# Altium footprint library PCB_LIB.PcbLib: 116 footprints (part 1 of 8)
Each footprint in its own frame and in the unit in brackets; x right, y up, seen from the top. Pads: shape width x height; smd on the part's side, far side on the other; paste and mask are expansions set on the pad; w line width, h text height; cw(c..) or ccw(c..) is an arc to the next point about the centre after c.
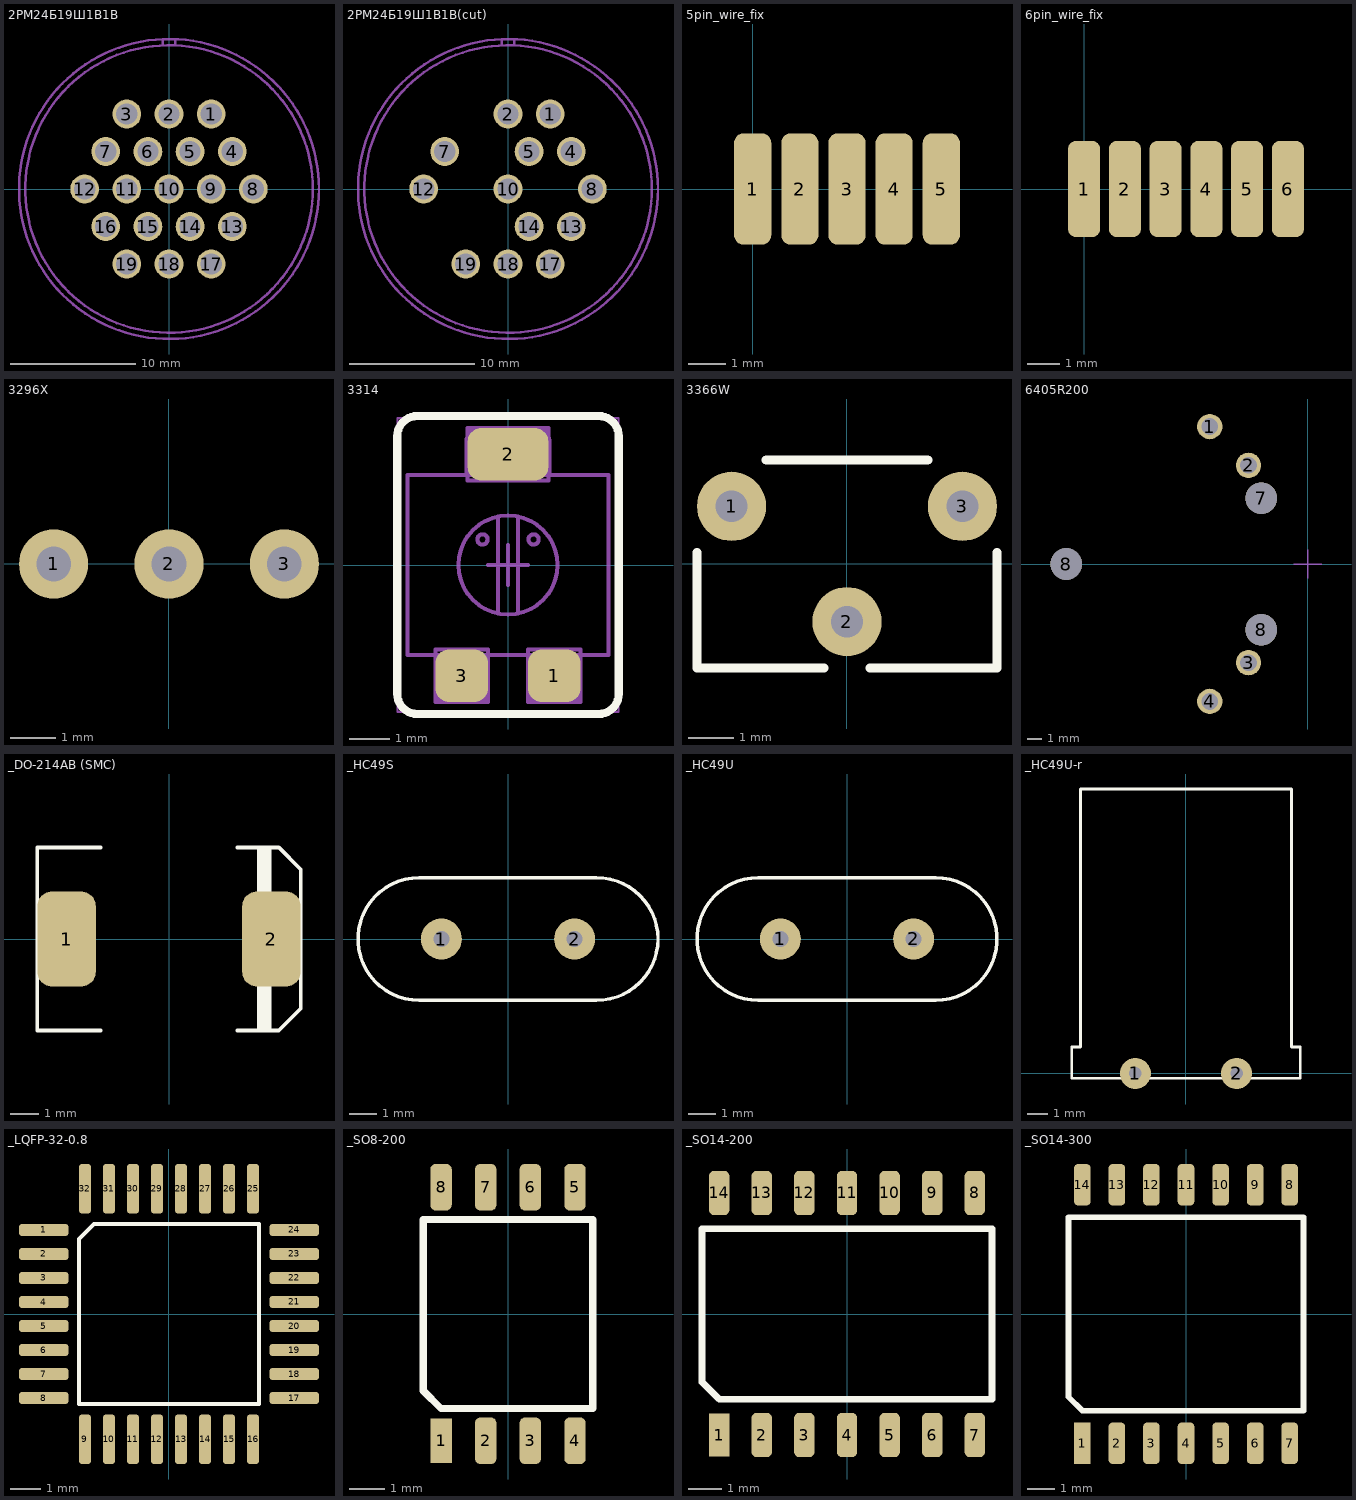
[diagram p0: the footprints below, top view; thin cyan lines are the x and y axes]

## 2РМ24Б19Ш1В1В [mm]
pads (19):
  round 2.3 hole 1.7: 1(3.375,6) 2(0,6) 3(-3.375,6) 4(5.062,3) 5(1.687,3) 6(-1.687,3) 7(-5.062,3) 8(6.75,0) 9(3.375,0) 10(0,0) 11(-3.375,0) 12(-6.75,0) 13(5.062,-3) 14(1.687,-3) 15(-1.687,-3) 16(-5.062,-3) 17(3.375,-6) 18(0,-6) 19(-3.375,-6)
Mechanical 14:
  circle w0.2: c0,0 r12
  circle w0.2: c0,0 r11.5
  lines w0.2: -0.5,11.5 -0.5,12 0.5,12 0.5,11.5

## 2РМ24Б19Ш1В1В(cut) [mm]
pads (13):
  round 2.3 hole 1.7: 1(3.375,6) 2(0,6) 4(5.062,3) 5(1.687,3) 7(-5.062,3) 8(6.75,0) 10(0,0) 12(-6.75,0) 13(5.062,-3) 14(1.687,-3) 17(3.375,-6) 18(0,-6) 19(-3.375,-6)
Mechanical 14:
  circle w0.2: c0,0 r12
  circle w0.2: c0,0 r11.5
  lines w0.2: -0.5,11.5 -0.5,12 0.5,12 0.5,11.5

## 5pin_wire_fix [mm]
pads (5):
  rrect50% 1x3 smd: 1(0,0) 2(1.27,0) 3(2.54,0) 4(3.81,0) 5(5.08,0)

## 6pin_wire_fix [mm]
pads (6):
  rrect50% 1x3 smd: 1(0,0) 2(1.27,0) 3(2.54,0) 4(3.81,0) 5(5.08,0) 6(6.35,0)

## 3296X [mil] "Потенциометр"
pads (3):
  round 60 hole 30: 1(-100,0) 2(0,0) 3(100,0)
3D body "User Library-3296X.step": height 394.88, standoff -62.99, extent -192.12,-100 242.12,88.98

## 3314 [mm] "Bourns 3314G-1 Single Turn 4mm Square Trimpot® Trimming Potentiometer (Top Adjust)"
height 2.55
pads (3):
  rrect50% 1.3x1.3 smd: 1(1.15,-2.75) 3(-1.15,-2.75)
  rrect50% 2x1.3 smd: 2(0,2.75)
Top Overlay:
  lines w0.2: -2.75,3.175 -2.75,-3.2 ccw(c-2.25,-3.2) -2.25,-3.7 2.25,-3.7 ccw(c2.25,-3.2) 2.75,-3.2 2.75,3.2 ccw(c2.25,3.2) 2.25,3.7 0,3.7 -2.225,3.7 ; -2.75,3.2 cw(c-2.25,3.2) -2.25,3.7
Mechanical 8:
  lines w0.1: -1.65,-2.75 -1.15,-2.75 ; -1.15,-3.25 -1.15,-2.75 ; -1.15,-2.25 -1.15,-2.75 ; -0.65,-2.75 -1.15,-2.75 ; -0.5,0 0,0 ; -0.5,2.75 0,2.75 ; 0,-0.5 0,0 ; 0,0.5 0,0 ; 0,2.25 0,2.75 ; 0,3.25 0,2.75 ; 0.5,0 0,0 ; 0.5,2.75 0,2.75 ; 0.65,-2.75 1.15,-2.75 ; 1.15,-3.25 1.15,-2.75 ; 1.15,-2.25 1.15,-2.75 ; 1.65,-2.75 1.15,-2.75 ; -1.8,-3.4 -1.8,-2.1 -0.5,-2.1 -0.5,-3.4 -1.8,-3.4 ; -1,2.1 -1,3.4 1,3.4 1,2.1 -1,2.1 ; 0.5,-3.4 0.5,-2.1 1.8,-2.1 1.8,-3.4 0.5,-3.4
Mechanical 14:
  circle w0.1: c0.635,0.635 r0.127
  circle w0.1: c-0.635,0.635 r0.127
  circle w0.1: c0,0 r1.23
  lines w0.1: -1.8,-2.235 -1.8,-3.1 ccw(c-1.5,-3.1) -1.5,-3.4 -0.775,-3.4 ; -1.575,-2.25 -1.575,-3.025 -0.725,-3.025 -0.725,-2.235 ; -1.025,2.235 -1.025,3.125 ; -1.025,3.1 cw(c-0.725,3.1) -0.725,3.4 ; -0.8,-3.4 ccw(c-0.8,-3.1) -0.5,-3.1 ; -0.8,2.235 -0.8,3.025 0.8,3.025 0.8,2.25 ; -0.75,3.4 0.725,3.4 cw(c0.725,3.1) 1.025,3.1 1.025,2.235 ; -0.5,-3.125 -0.5,-2.235 ; -0.254,-1.203 -0.254,1.204 ; 0.254,-1.203 0.254,1.204 ; 0.5,-2.235 0.5,-3.1 ccw(c0.8,-3.1) 0.8,-3.4 1.525,-3.4 ; 0.725,-2.25 0.725,-3.025 1.575,-3.025 1.575,-2.235 ; 1.5,-3.4 ccw(c1.5,-3.1) 1.8,-3.1 ; 1.8,-3.125 1.8,-2.235 ; -2.5,-2.235 -2.5,2.235 2.5,2.235 2.5,-2.235 -2.5,-2.235
  text ".Comment" at -2.8,-4.75 h1.5
  text ".Designator" at -2.3,-2.335 h1
Mechanical 15:
  lines w0.05: -0.5,0 0.5,0 ; 0,-0.5 0,0.5 ; -2.75,-3.65 -2.75,3.65 2.75,3.65 2.75,-3.65 -2.75,-3.65
3D body "TRIM_BOURNS_3314G-1.stp": height 2.73, standoff 0, extent -2.499,-3.099 2.5,3.099

## 3366W [mil]
pads (3):
  round 60 hole 27.56: 1(-100,50) 2(0,-50) 3(100,50)
Top Overlay:
  lines w7.87: -130,10 -130,-90 -20,-90 ; -70,90 70,90 ; 20,-90 130,-90 130,10
3D body "3266w-1-103.stp": height 312.31, standoff -81.15, extent -132,-90 132,87

## 6405R200 [mm] "Stepper Motor"
pads (7):
  round 1.8 hole 1.2: 1(-6.97,9.785) 2(-4.21,7.03) 3(-4.21,-7.03) 4(-6.97,-9.785)
  round 2.25 hole 2.25: 7(-3.3,4.69) 8(-17.2,0) 8(-3.3,-4.69)
Mechanical 1:
  lines w0.1: -1,0 1,0 ; 0,-1 0,1
3D body "User Library-6405r407-6405-1565.step": height 11.81, standoff -14.7, extent -21,-13.325 8.502,13.325

## _DO-214AB (SMC) [mil] "DO-214-AB/SMC; 2 C-Bend Leads; Body 7.9 x 5.9 mm, inc. leads (LxW)"
height 101.18
pads (2):
  rrect50% 80x130 smd: 1(-140,0) 2(140,0)
Top Overlay:
  rectangle: 120,-125 140,125
  lines w5: -93.5,-125 -180,-125 -180,125 -93.5,125 ; 93.5,-125 150,-125 180,-95 180,94.89 150.22,125 93.5,125
3D body "SMC (DO214AB).STEP": height 94.53, standoff -1.97, extent -153.55,-116 153.54,116.28

## _HC49S [mm]
pads (2):
  round 1.5 hole 0.6: 1(-2.44,0) 2(2.44,0)
Top Overlay:
  lines w0.127: 3.239,-2.25 -3.25,-2.25 cw(c-3.25,0) -3.25,2.25 3.24,2.25 cw(c3.25,0) 3.239,-2.25
3D body "HP49US.STEP": height 3.7, standoff -2.5, extent -5.5,-2.25 5.5,2.25

## _HC49U [mm]
pads (2):
  round 1.5 hole 0.6: 1(-2.44,0) 2(2.44,0)
Top Overlay:
  lines w0.127: -3.25,-2.25 cw(c-3.25,0) -3.25,2.25 3.25,2.25 cw(c3.25,0) 3.25,-2.25 -3.25,-2.25
3D body "HP49U.STEP": height 12.7, standoff -2.5, extent -5.5,-2.25 5.5,2.25

## _HC49U-r [mm]
pads (2):
  round 1.5 hole 0.6: 1(-2.44,0) 2(2.44,0)
Top Overlay:
  lines w0.127: -5.5,-0.23 -5.5,1.27 -5.08,1.27 -5.08,13.7 5.08,13.7 5.08,1.27 5.5,1.27 5.5,-0.23 -5.5,-0.23
3D body "HP49U-R.STEP": height 4.5, standoff -2.5, extent -5.5,-0.23 5.5,13.7

## _LQFP-32-0.8 [mm]
pads (32):
  rrect50% 1.65x0.4 smd: 1(-4.175,2.8) 2(-4.175,2) 3(-4.175,1.2) 4(-4.175,0.4) 5(-4.175,-0.4) 6(-4.175,-1.2) 7(-4.175,-2) 8(-4.175,-2.8) 17(4.175,-2.8) 18(4.175,-2) 19(4.175,-1.2) 20(4.175,-0.4) 21(4.175,0.4) 22(4.175,1.2) 23(4.175,2) 24(4.175,2.8)
  rrect50% 0.4x1.65 smd: 9(-2.8,-4.175) 10(-2,-4.175) 11(-1.2,-4.175) 12(-0.4,-4.175) 13(0.4,-4.175) 14(1.2,-4.175) 15(2,-4.175) 16(2.8,-4.175) 25(2.8,4.175) 26(2,4.175) 27(1.2,4.175) 28(0.4,4.175) 29(-0.4,4.175) 30(-1.2,4.175) 31(-2,4.175) 32(-2.8,4.175)
Top Overlay:
  lines w0.127: -3,-3 3,-3 3,3 -2.5,3 -3,2.5 -3,-3
3D body "LQFP32-0.8.STEP": height 1.65, standoff -0.01, extent -4.519,-4.519 4.519,4.519

## _SO8-200 [mil]
pads (8):
  rect 24x50 smd mask+4: 1(-75,-142)
  rrect50% 24x52 smd mask+4: 2(-25,-142) 3(25,-142) 4(75,-142) 5(75,142) 6(25,142) 7(-25,142) 8(-75,142)
Top Overlay:
  lines w8: -95,-86 -95,106 95,106 95,-106 -75,-106 -95,-86
3D body "SO8-200.STEP": height 67, standoff 0, extent -95,-161 95,161

## _SO14-200 [mil]
pads (14):
  rect 24x50 smd mask+4: 1(-150,-142)
  rrect50% 24x52 smd mask+4: 2(-100,-142) 3(-50,-142) 4(0,-142) 5(50,-142) 6(100,-142) 7(150,-142) 8(150,142) 9(100,142) 10(50,142) 11(0,142) 12(-50,142) 13(-100,142) 14(-150,142)
Top Overlay:
  lines w8: -170,-80 -170,100 170,100 170,-100 -150,-100 -170,-80
3D body "SO14-200.STEP": height 67, standoff 0, extent -170.01,-161 169.99,160.99

## _SO14-300 [mil]
pads (14):
  rect 24x60 smd: 1(-150,-187)
  rrect50% 24x60 smd: 2(-100,-187) 3(-50,-187) 4(0,-187) 5(50,-187) 6(100,-187) 7(150,-187) 8(150,187) 9(100,187) 10(50,187) 11(0,187) 12(-50,187) 13(-100,187) 14(-150,187)
Top Overlay:
  lines w8: -170,-120 -170,140 170,140 170,-140 -150,-140 -170,-120
3D body "SOIC14-300.STEP": height 67, standoff 0, extent -170,-209.5 170,209.5